# Altium footprint library sun_library.PcbLib: 412 footprints (part 16 of 26) (continued)
## QFN36_3.9 [mm] "36-Lead thin QFN, 0.5mm Pitch, 6mm x 6mm body"
height 0.85
pads (37):
  rect 0.85x0.21 smd paste-0.15 mask+0.05: 1(-3,2) 2(-3,1.5) 3(-3,1) 4(-3,0.5) 5(-3,0) 6(-3,-0.5) 7(-3,-1) 8(-3,-1.5) 9(-3,-2) 19(3,-2) 20(3,-1.5) 21(3,-1) 22(3,-0.5) 23(3,0) 24(3,0.5) 25(3,1) 26(3,1.5) 27(3,2)
  rect 0.21x0.85 smd paste-0.15 mask+0.05: 10(-2,-3) 11(-1.5,-3) 12(-1,-3) 13(-0.5,-3) 14(0,-3) 15(0.5,-3) 16(1,-3) 17(1.5,-3) 18(2,-3) 28(2,3) 29(1.5,3) 30(1,3) 31(0.5,3) 32(0,3) 33(-0.5,3) 34(-1,3) 35(-1.5,3) 36(-2,3)
  rect 3.9x3.9 smd paste-3: 37(0,0)
via -1.7,0.7 diameter 0.6 hole 0.3
via -1.7,-0.6 diameter 0.6 hole 0.3
via -0.6,1.7 diameter 0.6 hole 0.3
via 0.7,1.7 diameter 0.6 hole 0.3
via 1.7,0.7 diameter 0.6 hole 0.3
via 0.7,0.7 diameter 0.6 hole 0.3
via -0.6,0.7 diameter 0.6 hole 0.3
via -0.6,-0.6 diameter 0.6 hole 0.3
via -0.6,-1.7 diameter 0.6 hole 0.3
via 0.7,-1.7 diameter 0.6 hole 0.3
via 0.7,-0.6 diameter 0.6 hole 0.3
via 1.6,-0.6 diameter 0.6 hole 0.3
Top Overlay:
  circle w0.15: c-3.95,2.25 r0.125
  lines w0.15: -3.1,-2.8 -3.1,-3.1 -2.8,-3.1 ; -3.1,2.8 -3.1,3.1 -2.8,3.1 ; 2.8,-3.1 3.1,-3.1 3.1,-2.8 ; 2.8,3.1 3.1,3.1 3.1,2.8
Top Paste:
  drawing of 45 lines, arcs and shapes, not listed
Bottom Solder:
  rectangle: -2.1,-2.1 2.1,2.1
TopAssy 13:
  circle w0.15: c-2.175,2.175 r0.5
  lines w0.15: -3.175,-2.063 -3.175,-1.937 ; -3.175,-1.563 -3.175,-1.438 ; -3.175,-1.063 -3.175,-0.938 ; -3.175,-0.563 -3.175,-0.438 ; -3.175,-0.063 -3.175,0.063 ; -3.175,0.437 -3.175,0.563 ; -3.175,0.937 -3.175,1.062 ; -3.175,1.437 -3.175,1.562 ; -3.175,1.937 -3.175,2.062 ; -2.062,-3.175 -1.937,-3.175 ; -2.063,3.175 -1.937,3.175 ; -1.562,-3.175 -1.437,-3.175 ; -1.563,3.175 -1.438,3.175 ; -1.062,-3.175 -0.937,-3.175 ; -1.063,3.175 -0.938,3.175 ; -0.563,-3.175 -0.437,-3.175 ; -0.563,3.175 -0.438,3.175 ; -0.063,-3.175 0.063,-3.175 ; -0.063,3.175 0.063,3.175 ; 0.438,-3.175 0.563,-3.175 ; 0.437,3.175 0.563,3.175 ; 0.938,-3.175 1.063,-3.175 ; 0.937,3.175 1.062,3.175 ; 1.438,-3.175 1.563,-3.175 ; 1.437,3.175 1.562,3.175 ; 1.937,-3.175 2.063,-3.175 ; 1.937,3.175 2.062,3.175 ; 3.175,-2.062 3.175,-1.937 ; 3.175,-1.562 3.175,-1.437 ; 3.175,-1.062 3.175,-0.937 ; 3.175,-0.563 3.175,-0.437 ; 3.175,-0.063 3.175,0.063 ; 3.175,0.438 3.175,0.563 ; 3.175,0.938 3.175,1.063 ; 3.175,1.438 3.175,1.563 ; 3.175,1.937 3.175,2.063 ; -3.075,-3.075 3.075,-3.075 3.075,3.075 -3.075,3.075 -3.075,-3.075
CourtTop 15:
  lines w0.05: -0.5,0 0.5,0 ; 0,-0.5 0,0.5 ; -3.65,-3.65 3.65,-3.65 3.65,3.65 -3.65,3.65 -3.65,-3.65
3D body "User Library-TQFN-36.STEP": height 0.8, standoff 0, extent -3.06,-3.06 3.06,3.06

## QFN40 [mm] "QFN, 40-Leads, Body 6x6mm, Pitch 0.5mm, IPC Medium Density"
height 0.8
pads (41):
  oval 0.8x0.25 smd mask+0.07: 1(-3,2.25) 2(-3,1.75) 3(-3,1.25) 4(-3,0.75) 5(-3,0.25) 6(-3,-0.25) 7(-3,-0.75) 8(-3,-1.25) 9(-3,-1.75) 10(-3,-2.25) 21(3,-2.25) 22(3,-1.75) 23(3,-1.25) 24(3,-0.75) 25(3,-0.25) 26(3,0.25) 27(3,0.75) 28(3,1.25) 29(3,1.75) 30(3,2.25)
  oval 0.25x0.8 smd mask+0.07: 11(-2.25,-3) 12(-1.75,-3) 13(-1.25,-3) 14(-0.75,-3) 15(-0.25,-3) 16(0.25,-3) 17(0.75,-3) 18(1.25,-3) 19(1.75,-3) 20(2.25,-3) 31(2.25,3) 32(1.75,3) 33(1.25,3) 34(0.75,3) 35(0.25,3) 36(-0.25,3) 37(-0.75,3) 38(-1.25,3) 39(-1.75,3) 40(-2.25,3)
  rect 4.3x4.3 smd paste-5 mask+0.07: 41(0,0)
via 1.5,1.5 diameter 0.6 hole 0.3
via 0.5,1.5 diameter 0.6 hole 0.3
via -0.5,1.5 diameter 0.6 hole 0.3
via -1.5,1.5 diameter 0.6 hole 0.3
via -1.5,0.5 diameter 0.6 hole 0.3
via -0.5,0.5 diameter 0.6 hole 0.3
via 0.5,0.5 diameter 0.6 hole 0.3
via 1.5,0.5 diameter 0.6 hole 0.3
via -1.5,-0.5 diameter 0.6 hole 0.3
via -0.5,-0.5 diameter 0.6 hole 0.3
via 0.5,-0.5 diameter 0.6 hole 0.3
via 1.5,-0.5 diameter 0.6 hole 0.3
via -1.5,-1.5 diameter 0.6 hole 0.3
via -0.5,-1.5 diameter 0.6 hole 0.3
via 0.5,-1.5 diameter 0.6 hole 0.3
via 1.5,-1.5 diameter 0.6 hole 0.3
Top Overlay:
  circle w0.15: c-3.95,2.25 r0.125
  lines w0.15: -3.1,-2.8 -3.1,-3.1 -2.8,-3.1 ; -3.1,2.8 -3.1,3.1 -2.8,3.1 ; 2.8,-3.1 3.1,-3.1 3.1,-2.8 ; 2.8,3.1 3.1,3.1 3.1,2.8
Top Paste:
  rectangle: -1.725,0.85 -0.825,1.75
  rectangle: -0.475,0.85 0.425,1.75
  rectangle: 0.775,0.85 1.675,1.75
  rectangle: -1.725,-0.4 -0.825,0.5
  rectangle: -0.475,-0.4 0.425,0.5
  rectangle: 0.775,-0.4 1.675,0.5
  rectangle: 0.775,-1.65 1.675,-0.75
  rectangle: -0.475,-1.65 0.425,-0.75
  rectangle: -1.725,-1.65 -0.825,-0.75
Bottom Solder:
  rectangle: -2.2,-2.2 2.2,2.2
TopAssy 13:
  circle w0.15: c-2.175,2.175 r0.5
  lines w0.15: -3.175,-2.312 -3.175,-2.187 ; -3.175,-1.813 -3.175,-1.687 ; -3.175,-1.313 -3.175,-1.188 ; -3.175,-0.813 -3.175,-0.688 ; -3.175,-0.313 -3.175,-0.188 ; -3.175,0.188 -3.175,0.313 ; -3.175,0.687 -3.175,0.813 ; -3.175,1.187 -3.175,1.312 ; -3.175,1.687 -3.175,1.812 ; -3.175,2.187 -3.175,2.312 ; -2.312,-3.175 -2.187,-3.175 ; -2.312,3.175 -2.187,3.175 ; -1.812,-3.175 -1.687,-3.175 ; -1.813,3.175 -1.687,3.175 ; -1.312,-3.175 -1.187,-3.175 ; -1.313,3.175 -1.188,3.175 ; -0.813,-3.175 -0.687,-3.175 ; -0.813,3.175 -0.688,3.175 ; -0.313,-3.175 -0.187,-3.175 ; -0.313,3.175 -0.187,3.175 ; 0.187,-3.175 0.313,-3.175 ; 0.187,3.175 0.313,3.175 ; 0.688,-3.175 0.813,-3.175 ; 0.687,3.175 0.813,3.175 ; 1.188,-3.175 1.313,-3.175 ; 1.187,3.175 1.312,3.175 ; 1.687,-3.175 1.813,-3.175 ; 1.687,3.175 1.812,3.175 ; 2.187,-3.175 2.312,-3.175 ; 2.187,3.175 2.312,3.175 ; 3.175,-2.312 3.175,-2.187 ; 3.175,-1.812 3.175,-1.687 ; 3.175,-1.312 3.175,-1.187 ; 3.175,-0.813 3.175,-0.687 ; 3.175,-0.313 3.175,-0.187 ; 3.175,0.187 3.175,0.313 ; 3.175,0.688 3.175,0.813 ; 3.175,1.188 3.175,1.313 ; 3.175,1.687 3.175,1.813 ; 3.175,2.187 3.175,2.312 ; -3.075,-3.075 3.075,-3.075 3.075,3.075 -3.075,3.075 -3.075,-3.075
CourtTop 15:
  lines w0.05: -0.5,0 0.5,0 ; 0,-0.5 0,0.5 ; -3.65,-3.65 3.65,-3.65 3.65,3.65 -3.65,3.65 -3.65,-3.65
3D body: height 0.8, standoff 0, extent -3.075,-3.075 3.075,3.075

## QFN43P50_900X350X80L40X25T700X150N [mm] "Quad Flat No-Lead (QFN with Tab), 0.50 mm pitch; rect., 17 pin X 4 pin, 9.00 mm L X 3.50 mm W X 0.80 mm H body"
height 0.8
pads (43):
  rrect52% 0.27x0.76 smd mask+0.05: 1(-4,-1.635) 2(-3.5,-1.635) 3(-3,-1.635) 4(-2.5,-1.635) 5(-2,-1.635) 6(-1.5,-1.635) 7(-1,-1.635) 8(-0.5,-1.635) 9(0,-1.635) 10(0.5,-1.635) 11(1,-1.635) 12(1.5,-1.635) 13(2,-1.635) 14(2.5,-1.635) 15(3,-1.635) 16(3.5,-1.635) 17(4,-1.635) 22(4,1.635) 23(3.5,1.635) 24(3,1.635) 25(2.5,1.635) 26(2,1.635) 27(1.5,1.635) 28(1,1.635) 29(0.5,1.635) 30(0,1.635) 31(-0.5,1.635) 32(-1,1.635) 33(-1.5,1.635) 34(-2,1.635) 35(-2.5,1.635) 36(-3,1.635) 37(-3.5,1.635) 38(-4,1.635)
  rrect52% 0.76x0.27 smd mask+0.05: 18(4.385,-0.75) 19(4.385,-0.25) 20(4.385,0.25) 21(4.385,0.75) 39(-4.385,0.75) 40(-4.385,0.25) 41(-4.385,-0.25) 42(-4.385,-0.75)
  rect 7x1.5 smd paste-7 mask+0.05: 43(0,0)
via 1.36,0 diameter 0.6 hole 0.3
via 2.72,0 diameter 0.6 hole 0.3
via 0,0 diameter 0.6 hole 0.3
via -1.36,0 diameter 0.6 hole 0.3
via -2.67,0 diameter 0.6 hole 0.3
Top Overlay:
  circle w0.15: c-4.875,-1.825 r0.125
  lines w0.15: -4.55,-1.25 -4.55,-1.8 -4.4,-1.8 ; -4.55,1.25 -4.55,1.8 -4.4,1.8 ; 4.4,-1.8 4.55,-1.8 4.55,-1.25 ; 4.4,1.8 4.55,1.8 4.55,1.25
Top Paste:
  region: 3.435,-0.415 2.165,-0.415 2.165,0.415 3.435,0.415
  region: 2.035,-0.415 0.765,-0.415 0.765,0.415 2.035,0.415
  region: 0.635,-0.415 -0.635,-0.415 -0.635,0.415 0.635,0.415
  region: -0.765,-0.415 -2.035,-0.415 -2.035,0.415 -0.765,0.415
  region: -2.165,-0.415 -3.435,-0.415 -3.435,0.415 -2.165,0.415
Bottom Solder:
  rectangle: -3.6,-0.8 3.6,0.8
TopAssy 13:
  drawing of 177 lines, arcs and shapes, not listed
CourtTop 15:
  circle w0.05: c0,0 r0.25
  lines w0.05: -0.35,0 0.35,0 ; 0,-0.35 0,0.35 ; -4.965,-1.085 -4.965,1.085 -4.75,1.085 -4.75,2 -4.335,2 -4.335,2.215 4.335,2.215 4.335,2 4.75,2 4.75,1.085 4.965,1.085 4.965,-1.085 4.75,-1.085 4.75,-2 4.335,-2 4.335,-2.215 -4.335,-2.215 -4.335,-2 -4.75,-2 -4.75,-1.085 -4.965,-1.085
3D body "QFN43P50_900X350X80L40X25T700X150.STEP": height 0.8, standoff 0, extent -4.55,-1.8 4.55,1.8

## QFN48 [mm] "QFN, 48-Leads, Body 7x7mm, Pitch 0.5mm, IPC Medium Density"
height 0.9
pads (49):
  oval 0.75x0.2 smd mask+0.075: 1(-3.525,2.75) 2(-3.525,2.25) 3(-3.525,1.75) 4(-3.525,1.25) 5(-3.525,0.75) 6(-3.525,0.25) 7(-3.525,-0.25) 8(-3.525,-0.75) 9(-3.525,-1.25) 10(-3.525,-1.75) 11(-3.525,-2.25) 12(-3.525,-2.75) 25(3.525,-2.75) 26(3.525,-2.25) 27(3.525,-1.75) 28(3.525,-1.25) 29(3.525,-0.75) 30(3.525,-0.25) 31(3.525,0.25) 32(3.525,0.75) 33(3.525,1.25) 34(3.525,1.75) 35(3.525,2.25) 36(3.525,2.75)
  oval 0.2x0.75 smd mask+0.075: 13(-2.75,-3.525) 14(-2.25,-3.525) 15(-1.75,-3.525) 16(-1.25,-3.525) 17(-0.75,-3.525) 18(-0.25,-3.525) 19(0.25,-3.525) 20(0.75,-3.525) 21(1.25,-3.525) 22(1.75,-3.525) 23(2.25,-3.525) 24(2.75,-3.525) 37(2.75,3.525) 38(2.25,3.525) 39(1.75,3.525) 40(1.25,3.525) 41(0.75,3.525) 42(0.25,3.525) 43(-0.25,3.525) 44(-0.75,3.525) 45(-1.25,3.525) 46(-1.75,3.525) 47(-2.25,3.525) 48(-2.75,3.525)
  rect 5.1x5.1 smd paste-3 mask+0.075: 49(0,0)
via -1,-1 diameter 0.6 hole 0.3
via -1,1 diameter 0.6 hole 0.3
via 1,1 diameter 0.6 hole 0.3
via 1,-1 diameter 0.6 hole 0.3
via 2,-2 diameter 0.6 hole 0.3
via -2,-2 diameter 0.6 hole 0.3
via 0,-2 diameter 0.6 hole 0.3
via 2,0 diameter 0.6 hole 0.3
via 2,2 diameter 0.6 hole 0.3
via 0,2 diameter 0.6 hole 0.3
via -2,2 diameter 0.6 hole 0.3
via -2,0 diameter 0.6 hole 0.3
via 0,0 diameter 0.6 hole 0.3
Top Overlay:
  circle w0.15: c-4.375,3.575 r0.125
  lines w0.15: -3.725,-3.3 -3.725,-3.725 -3.3,-3.725 ; -3.725,3.3 -3.725,3.725 -3.3,3.725 ; 3.3,-3.725 3.725,-3.725 3.725,-3.3 ; 3.3,3.725 3.725,3.725 3.725,3.3
Top Paste:
  rectangle: 1.35,1.35 2.25,2.25
  rectangle: 0.15,1.35 1.05,2.25
  rectangle: -1.05,1.35 -0.15,2.25
  rectangle: -2.25,1.35 -1.35,2.25
  rectangle: -2.25,0.15 -1.35,1.05
  rectangle: -1.05,0.15 -0.15,1.05
  rectangle: 0.15,0.15 1.05,1.05
  rectangle: 1.35,0.15 2.25,1.05
  rectangle: 1.35,-1.05 2.25,-0.15
  rectangle: 0.15,-1.05 1.05,-0.15
  rectangle: -1.05,-1.05 -0.15,-0.15
  rectangle: -2.25,-1.05 -1.35,-0.15
  rectangle: -2.25,-2.25 -1.35,-1.35
  rectangle: -1.05,-2.25 -0.15,-1.35
  rectangle: 0.15,-2.25 1.05,-1.35
  rectangle: 1.35,-2.25 2.25,-1.35
Bottom Solder:
  rectangle: -2.6,-2.6 2.6,2.6
TopAssy 13:
  circle w0.15: c-2.675,2.675 r0.5
  lines w0.15: -3.675,-2.812 -3.675,-2.687 ; -3.675,-2.312 -3.675,-2.187 ; -3.675,-1.812 -3.675,-1.687 ; -3.675,-1.312 -3.675,-1.187 ; -3.675,-0.813 -3.675,-0.687 ; -3.675,-0.313 -3.675,-0.187 ; -3.675,0.188 -3.675,0.313 ; -3.675,0.688 -3.675,0.813 ; -3.675,1.188 -3.675,1.313 ; -3.675,1.687 -3.675,1.813 ; -3.675,2.188 -3.675,2.313 ; -3.675,2.688 -3.675,2.813 ; -2.813,-3.675 -2.688,-3.675 ; -2.812,3.675 -2.687,3.675 ; -2.313,-3.675 -2.188,-3.675 ; -2.312,3.675 -2.187,3.675 ; -1.813,-3.675 -1.687,-3.675 ; -1.812,3.675 -1.687,3.675 ; -1.313,-3.675 -1.188,-3.675 ; -1.312,3.675 -1.187,3.675 ; -0.813,-3.675 -0.688,-3.675 ; -0.813,3.675 -0.687,3.675 ; -0.313,-3.675 -0.188,-3.675 ; -0.313,3.675 -0.187,3.675 ; 0.187,-3.675 0.313,-3.675 ; 0.188,3.675 0.313,3.675 ; 0.687,-3.675 0.813,-3.675 ; 0.688,3.675 0.813,3.675 ; 1.187,-3.675 1.312,-3.675 ; 1.188,3.675 1.313,3.675 ; 1.687,-3.675 1.812,-3.675 ; 1.687,3.675 1.813,3.675 ; 2.187,-3.675 2.312,-3.675 ; 2.188,3.675 2.313,3.675 ; 2.687,-3.675 2.812,-3.675 ; 2.688,3.675 2.813,3.675 ; 3.675,-2.813 3.675,-2.688 ; 3.675,-2.313 3.675,-2.188 ; 3.675,-1.813 3.675,-1.687 ; 3.675,-1.313 3.675,-1.188 ; 3.675,-0.813 3.675,-0.688 ; 3.675,-0.313 3.675,-0.188 ; 3.675,0.187 3.675,0.312 ; 3.675,0.687 3.675,0.813 ; 3.675,1.187 3.675,1.312 ; 3.675,1.687 3.675,1.812 ; 3.675,2.187 3.675,2.312 ; 3.675,2.687 3.675,2.812 ; -3.575,-3.575 -3.575,3.575 3.575,3.575 3.575,-3.575 -3.575,-3.575
CourtTop 15:
  lines w0.05: -0.5,0 0.5,0 ; 0,-0.5 0,0.5 ; -4.15,-4.15 -4.15,4.15 4.15,4.15 4.15,-4.15 -4.15,-4.15
3D body "User Library-QFN48_7x7.STEP": height 0.78, standoff -0.02, extent -3.51,-3.51 3.51,3.51

## QFN48P40_P600X600X90 [mm]
height 0.9
pads (49):
  oval 0.65x0.2 smd mask+0.05: 1(-3.025,2.2) 2(-3.025,1.8) 3(-3.025,1.4) 4(-3.025,1) 5(-3.025,0.6) 6(-3.025,0.2) 7(-3.025,-0.2) 8(-3.025,-0.6) 9(-3.025,-1) 10(-3.025,-1.4) 11(-3.025,-1.8) 12(-3.025,-2.2) 25(3.025,-2.2) 26(3.025,-1.8) 27(3.025,-1.4) 28(3.025,-1) 29(3.025,-0.6) 30(3.025,-0.2) 31(3.025,0.2) 32(3.025,0.6) 33(3.025,1) 34(3.025,1.4) 35(3.025,1.8) 36(3.025,2.2)
  oval 0.2x0.65 smd mask+0.05: 13(-2.2,-3.025) 14(-1.8,-3.025) 15(-1.4,-3.025) 16(-1,-3.025) 17(-0.6,-3.025) 18(-0.2,-3.025) 19(0.2,-3.025) 20(0.6,-3.025) 21(1,-3.025) 22(1.4,-3.025) 23(1.8,-3.025) 24(2.2,-3.025) 37(2.2,3.025) 38(1.8,3.025) 39(1.4,3.025) 40(1,3.025) 41(0.6,3.025) 42(0.2,3.025) 43(-0.2,3.025) 44(-0.6,3.025) 45(-1,3.025) 46(-1.4,3.025) 47(-1.8,3.025) 48(-2.2,3.025)
  rect 4.6x4.6 smd paste-3.9 mask+0.075: 49(0,0)
via -1.8,1.8 diameter 0.7 hole 0.3
via -0.6,1.8 diameter 0.7 hole 0.3
via 0.6,1.8 diameter 0.7 hole 0.3
via 1.8,1.8 diameter 0.7 hole 0.3
via -1.8,0.6 diameter 0.7 hole 0.3
via -0.6,0.6 diameter 0.7 hole 0.3
via 0.6,0.6 diameter 0.7 hole 0.3
via 1.8,0.6 diameter 0.7 hole 0.3
via -1.8,-0.6 diameter 0.7 hole 0.3
via -0.6,-0.6 diameter 0.7 hole 0.3
via 0.6,-0.6 diameter 0.7 hole 0.3
via 1.8,-0.6 diameter 0.7 hole 0.3
via -1.8,-1.8 diameter 0.7 hole 0.3
via -0.6,-1.8 diameter 0.7 hole 0.3
via 0.6,-1.8 diameter 0.7 hole 0.3
via 1.8,-1.8 diameter 0.7 hole 0.3
Top Overlay:
  circle w0.25: c-3.5,2.8 r0.125
  lines w0.2: -3.1,-2.7 -3.1,-3.1 -2.7,-3.1 ; -3.1,2.7 -3.1,3.1 -2.7,3.1 ; 2.7,-3.1 3.1,-3.1 3.1,-2.7 ; 2.7,3.1 3.1,3.1 3.1,2.7
Top Paste:
  rectangle: 1.35,-2.25 2.25,-1.35
  rectangle: 0.15,-2.25 1.05,-1.35
  rectangle: -1.05,-2.25 -0.15,-1.35
  rectangle: -2.25,-2.25 -1.35,-1.35
  rectangle: -2.25,-1.05 -1.35,-0.15
  rectangle: -1.05,-1.05 -0.15,-0.15
  rectangle: 0.15,-1.05 1.05,-0.15
  rectangle: 1.35,-1.05 2.25,-0.15
  rectangle: 1.35,0.15 2.25,1.05
  rectangle: 0.15,0.15 1.05,1.05
  rectangle: -1.05,0.15 -0.15,1.05
  rectangle: -2.25,0.15 -1.35,1.05
  rectangle: -2.25,1.35 -1.35,2.25
  rectangle: -1.05,1.35 -0.15,2.25
  rectangle: 0.15,1.35 1.05,2.25
  rectangle: 1.35,1.35 2.25,2.25
Bottom Solder:
  rectangle: -2.4,-2.4 2.4,2.4
TopAssy 13:
  drawing of 197 lines, arcs and shapes, not listed
CourtTop 15:
  lines w0.1: -0.5,0 0.5,0 ; 0,-0.5 0,0.5 ; -3.6,-3.6 -3.6,3.6 3.6,3.6 3.6,-3.6 -3.6,-3.6
3D body "User Library-QFN48.step": height 0.86, standoff -0.01, extent -3.02,-3.02 3.02,3.02

## QFN49P40_600X600X100L40X17T440N [mm] "Quad Flat No-Lead (QFN with Tab), 0.40 mm pitch; square, 12 pin X 12 pin, 6.00 mm L X 6.00 mm W X 1.00 mm H body"
height 1
pads (49):
  rrect53% 0.8x0.19 smd mask+0.075: 1(-2.885,2.2) 2(-2.885,1.8) 3(-2.885,1.4) 4(-2.885,1) 5(-2.885,0.6) 6(-2.885,0.2) 7(-2.885,-0.2) 8(-2.885,-0.6) 9(-2.885,-1) 10(-2.885,-1.4) 11(-2.885,-1.8) 12(-2.885,-2.2) 25(2.885,-2.2) 26(2.885,-1.8) 27(2.885,-1.4) 28(2.885,-1) 29(2.885,-0.6) 30(2.885,-0.2) 31(2.885,0.2) 32(2.885,0.6) 33(2.885,1) 34(2.885,1.4) 35(2.885,1.8) 36(2.885,2.2)
  rrect53% 0.19x0.8 smd mask+0.075: 13(-2.2,-2.885) 14(-1.8,-2.885) 15(-1.4,-2.885) 16(-1,-2.885) 17(-0.6,-2.885) 18(-0.2,-2.885) 19(0.2,-2.885) 20(0.6,-2.885) 21(1,-2.885) 22(1.4,-2.885) 23(1.8,-2.885) 24(2.2,-2.885) 37(2.2,2.885) 38(1.8,2.885) 39(1.4,2.885) 40(1,2.885) 41(0.6,2.885) 42(0.2,2.885) 43(-0.2,2.885) 44(-0.6,2.885) 45(-1,2.885) 46(-1.4,2.885) 47(-1.8,2.885) 48(-2.2,2.885)
  rect 3.9x3.9 smd paste-3.9 mask+0.075: 49(0,0)
via 1.5,0.5 diameter 0.6 hole 0.3
via 0.5,1.5 diameter 0.6 hole 0.3
via 1.5,1.5 diameter 0.6 hole 0.3
via 0.5,0.5 diameter 0.6 hole 0.3
via 1.5,-0.5 diameter 0.6 hole 0.3
via 1.5,-1.5 diameter 0.6 hole 0.3
via 0.5,-0.5 diameter 0.6 hole 0.3
via 0.5,-1.5 diameter 0.6 hole 0.3
via -0.5,0.5 diameter 0.6 hole 0.3
via -0.5,1.5 diameter 0.6 hole 0.3
via -1.5,1.5 diameter 0.6 hole 0.3
via -1.5,0.5 diameter 0.6 hole 0.3
via -0.5,-0.5 diameter 0.6 hole 0.3
via -0.5,-1.5 diameter 0.6 hole 0.3
via -1.5,-0.5 diameter 0.6 hole 0.3
via -1.5,-1.5 diameter 0.6 hole 0.3
Top:
  region: 0,-2.2 -2.1,-2.2 -2.116,-2.199 -2.131,-2.195 -2.145,-2.189 -2.159,-2.181 -2.171,-2.171 -2.181,-2.159 -2.189,-2.145 -2.195,-2.131 -2.199,-2.116 -2.2,1.95 -1.95,2.2 2.1,2.2 2.116,2.199 2.131,2.195 2.145,2.189 2.159,2.181 2.171,2.171 2.181,2.159 2.189,2.145 2.195,2.131 2.199,2.116 2.2,-2.1 2.199,-2.116 2.195,-2.131 2.189,-2.145 2.181,-2.159 2.171,-2.171 2.159,-2.181 2.145,-2.189 2.131,-2.195 2.116,-2.199 2.1,-2.2
Top Overlay:
  circle w0.15: c-3.645,2.2 r0.075
  lines w0.15: -3.135,2.58 -3.075,2.58 -3.075,3.075 -2.58,3.075 ; -3.075,-2.58 -3.075,-3.075 -2.58,-3.075 ; 2.58,-3.075 3.075,-3.075 3.075,-2.58 ; 2.58,3.075 3.075,3.075 3.075,2.58
Top Paste:
  region: 0.32,0.32 0.32,1.88 1.88,1.88 1.88,0.32
  region: 0.32,-1.88 0.32,-0.32 1.88,-0.32 1.88,-1.88
  region: -1.88,0.32 -1.88,1.88 -0.32,1.88 -0.32,0.32
  region: -1.88,-1.88 -1.88,-0.32 -0.32,-0.32 -0.32,-1.88
Top Solder:
  region: 0,-2.2 -2.1,-2.2 -2.116,-2.199 -2.131,-2.195 -2.145,-2.189 -2.159,-2.181 -2.171,-2.171 -2.181,-2.159 -2.189,-2.145 -2.195,-2.131 -2.199,-2.116 -2.2,1.95 -1.95,2.2 2.1,2.2 2.116,2.199 2.131,2.195 2.145,2.189 2.159,2.181 2.171,2.171 2.181,2.159 2.189,2.145 2.195,2.131 2.199,2.116 2.2,-2.1 2.199,-2.116 2.195,-2.131 2.189,-2.145 2.181,-2.159 2.171,-2.171 2.159,-2.181 2.145,-2.189 2.131,-2.195 2.116,-2.199 2.1,-2.2
Bottom Solder:
  rectangle: -2.3,-2.3 2.3,2.3
TopAssy 13:
  drawing of 205 lines, arcs and shapes, not listed
CourtTop 15:
  circle w0.05: c0,0 r0.25
  lines w0.05: -0.35,0 0.35,0 ; 0,-0.35 0,0.35 ; -3.485,-2.495 -3.485,2.495 -3.28,2.495 -3.28,3.28 -2.495,3.28 -2.495,3.485 2.495,3.485 2.495,3.28 3.28,3.28 3.28,2.495 3.485,2.495 3.485,-2.495 3.28,-2.495 3.28,-3.28 2.495,-3.28 2.495,-3.485 -2.495,-3.485 -2.495,-3.28 -3.28,-3.28 -3.28,-2.495 -3.485,-2.495
3D body "QFN49P40_600X600X100L40X17T440.STEP": height 1, standoff 0, extent -3.05,-3.05 3.05,3.05

## QFN57P50_1100X500X80L40X24T840X240N [mm] "Quad Flat No-Lead (QFN with Tab), 0.50 mm pitch; rect., 20 pin X 8 pin, 11.00 mm L X 5.00 mm W X 0.80 mm H body"
height 0.8
pads (57):
  rrect54% 0.26x0.78 smd mask+0.05: 1(-4.75,-2.385) 2(-4.25,-2.385) 3(-3.75,-2.385) 4(-3.25,-2.385) 5(-2.75,-2.385) 6(-2.25,-2.385) 7(-1.75,-2.385) 8(-1.25,-2.385) 9(-0.75,-2.385) 10(-0.25,-2.385) 11(0.25,-2.385) 12(0.75,-2.385) 13(1.25,-2.385) 14(1.75,-2.385) 15(2.25,-2.385) 16(2.75,-2.385) 17(3.25,-2.385) 18(3.75,-2.385) 19(4.25,-2.385) 20(4.75,-2.385) 29(4.75,2.385) 30(4.25,2.385) 31(3.75,2.385) 32(3.25,2.385) 33(2.75,2.385) 34(2.25,2.385) 35(1.75,2.385) 36(1.25,2.385) 37(0.75,2.385) 38(0.25,2.385) 39(-0.25,2.385) 40(-0.75,2.385) 41(-1.25,2.385) 42(-1.75,2.385) 43(-2.25,2.385) 44(-2.75,2.385) 45(-3.25,2.385) 46(-3.75,2.385) 47(-4.25,2.385) 48(-4.75,2.385)
  rrect54% 0.78x0.26 smd mask+0.05: 21(5.385,-1.75) 22(5.385,-1.25) 23(5.385,-0.75) 24(5.385,-0.25) 25(5.385,0.25) 26(5.385,0.75) 27(5.385,1.25) 28(5.385,1.75) 49(-5.385,1.75) 50(-5.385,1.25) 51(-5.385,0.75) 52(-5.385,0.25) 53(-5.385,-0.25) 54(-5.385,-0.75) 55(-5.385,-1.25) 56(-5.385,-1.75)
  rect 8.4x2.4 smd paste-8.4 mask+0.05: 57(0,0)
via 1.36,0.7 diameter 0.6 hole 0.3
via 2.72,0.7 diameter 0.6 hole 0.3
via 0,0.7 diameter 0.6 hole 0.3
via -1.36,0.7 diameter 0.6 hole 0.3
via -2.67,0.7 diameter 0.6 hole 0.3
via 1.36,-0.6 diameter 0.6 hole 0.3
via 2.72,-0.6 diameter 0.6 hole 0.3
via 0,-0.6 diameter 0.6 hole 0.3
via -1.36,-0.6 diameter 0.6 hole 0.3
via -2.67,-0.6 diameter 0.6 hole 0.3
Top Overlay:
  circle w0.15: c-5.4,-3 r0.125
  lines w0.15: -5.6,-2.2 -5.6,-2.6 -5.2,-2.6 ; -5.6,2.2 -5.6,2.6 -5.2,2.6 ; 5.2,-2.6 5.6,-2.6 5.6,-2.2 ; 5.2,2.6 5.6,2.6 5.6,2.2
Top Paste:
  region: 4.115,-0.685 2.885,-0.685 2.885,0.685 4.115,0.685
  region: 2.715,-0.685 1.485,-0.685 1.485,0.685 2.715,0.685
  region: 1.315,-0.685 0.085,-0.685 0.085,0.685 1.315,0.685
  region: -0.085,-0.685 -1.315,-0.685 -1.315,0.685 -0.085,0.685
  region: -1.485,-0.685 -2.715,-0.685 -2.715,0.685 -1.485,0.685
  region: -2.885,-0.685 -4.115,-0.685 -4.115,0.685 -2.885,0.685
Bottom Solder:
  rectangle: -4.3,-1.3 4.3,1.3
TopAssy 13:
  drawing of 232 lines, arcs and shapes, not listed
CourtTop 15:
  circle w0.05: c0,0 r0.25
  lines w0.05: -0.35,0 0.35,0 ; 0,-0.35 0,0.35 ; -5.975,-2.08 -5.975,2.08 -5.78,2.08 -5.78,2.78 -5.08,2.78 -5.08,2.975 5.08,2.975 5.08,2.78 5.78,2.78 5.78,2.08 5.975,2.08 5.975,-2.08 5.78,-2.08 5.78,-2.78 5.08,-2.78 5.08,-2.975 -5.08,-2.975 -5.08,-2.78 -5.78,-2.78 -5.78,-2.08 -5.975,-2.08
3D body "QFN57P50_1100X500X80L40X24T840X240.STEP": height 0.8, standoff 0, extent -5.55,-2.55 5.55,2.55

## QFN64 [mm] "QFN, 64-Leads, Body 9,00x9,00mm, Pitch 0,50mm, Thermal Pad 5,75x5,75mm, IPC Medium Density"
height 1
pads (65):
  oct 0.75x0.23 smd mask+0.07: 1(-4.475,3.75) 2(-4.475,3.25) 3(-4.475,2.75) 4(-4.475,2.25) 5(-4.475,1.75) 6(-4.475,1.25) 7(-4.475,0.75) 8(-4.475,0.25) 9(-4.475,-0.25) 10(-4.475,-0.75) 11(-4.475,-1.25) 12(-4.475,-1.75) 13(-4.475,-2.25) 14(-4.475,-2.75) 15(-4.475,-3.25) 16(-4.475,-3.75) 33(4.475,-3.75) 34(4.475,-3.25) 35(4.475,-2.75) 36(4.475,-2.25) 37(4.475,-1.75) 38(4.475,-1.25) 39(4.475,-0.75) 40(4.475,-0.25) 41(4.475,0.25) 42(4.475,0.75) 43(4.475,1.25) 44(4.475,1.75) 45(4.475,2.25) 46(4.475,2.75) 47(4.475,3.25) 48(4.475,3.75)
  oct 0.23x0.75 smd mask+0.07: 17(-3.75,-4.475) 18(-3.25,-4.475) 19(-2.75,-4.475) 20(-2.25,-4.475) 21(-1.75,-4.475) 22(-1.25,-4.475) 23(-0.75,-4.475) 24(-0.25,-4.475) 25(0.25,-4.475) 26(0.75,-4.475) 27(1.25,-4.475) 28(1.75,-4.475) 29(2.25,-4.475) 30(2.75,-4.475) 31(3.25,-4.475) 32(3.75,-4.475) 49(3.75,4.475) 50(3.25,4.475) 51(2.75,4.475) 52(2.25,4.475) 53(1.75,4.475) 54(1.25,4.475) 55(0.75,4.475) 56(0.25,4.475) 57(-0.25,4.475) 58(-0.75,4.475) 59(-1.25,4.475) 60(-1.75,4.475) 61(-2.25,4.475) 62(-2.75,4.475) 63(-3.25,4.475) 64(-3.75,4.475)
  rect 7.2x7.2 smd paste-4: 65(0,0)
via -2.04,3.35 diameter 0.6 hole 0.3
via -0.68,3.35 diameter 0.6 hole 0.3
via 0.68,3.35 diameter 0.6 hole 0.3
via 2.04,3.35 diameter 0.6 hole 0.3
via -3.35,0.68 diameter 0.6 hole 0.3
via -2.04,0.68 diameter 0.6 hole 0.3
via -0.68,0.68 diameter 0.6 hole 0.3
via 0.68,0.68 diameter 0.6 hole 0.3
via 2.04,0.68 diameter 0.6 hole 0.3
via 3.35,0.68 diameter 0.6 hole 0.3
via 2.04,-0.68 diameter 0.6 hole 0.3
via 0.68,-0.68 diameter 0.6 hole 0.3
via -0.68,-0.68 diameter 0.6 hole 0.3
via -2.04,-0.68 diameter 0.6 hole 0.3
via -3.35,-0.68 diameter 0.6 hole 0.3
via 3.35,-0.68 diameter 0.6 hole 0.3
via 3.35,-2.04 diameter 0.6 hole 0.3
via 2.04,-2.04 diameter 0.6 hole 0.3
via 0.68,-2.04 diameter 0.6 hole 0.3
via -0.68,-2.04 diameter 0.6 hole 0.3
via -2.04,-2.04 diameter 0.6 hole 0.3
via -3.35,-2.04 diameter 0.6 hole 0.3
via -2.04,-3.35 diameter 0.6 hole 0.3
via -0.68,-3.35 diameter 0.6 hole 0.3
via 0.68,-3.35 diameter 0.6 hole 0.3
via 2.04,-3.35 diameter 0.6 hole 0.3
via -3.35,2.04 diameter 0.6 hole 0.3
via -2.04,2.04 diameter 0.6 hole 0.3
via -0.68,2.04 diameter 0.6 hole 0.3
via 2.04,2.04 diameter 0.6 hole 0.3
via 3.35,2.04 diameter 0.6 hole 0.3
via 0.68,2.04 diameter 0.6 hole 0.3
Top Overlay:
  circle w0.15: c-5.375,4.575 r0.125
  lines w0.15: -4.6,-4.2 -4.6,-4.6 -4.2,-4.6 ; -4.6,4.2 -4.6,4.6 -4.2,4.6 ; 4.2,-4.6 4.6,-4.6 4.6,-4.2 ; 4.2,4.6 4.6,4.6 4.6,4.2
Top Paste:
  rectangle: -3.3,-3.335 -2.14,-2.175
  rectangle: -1.94,-3.335 -0.78,-2.175
  rectangle: -0.58,-3.335 0.58,-2.175
  rectangle: 0.78,-3.335 1.94,-2.175
  rectangle: -3.3,-1.975 -2.14,-0.815
  rectangle: -1.94,-1.975 -0.78,-0.815
  rectangle: -0.58,-1.975 0.58,-0.815
  rectangle: 0.78,-1.975 1.94,-0.815
  rectangle: -3.3,-0.615 -2.14,0.545
  rectangle: -1.94,-0.615 -0.78,0.545
  rectangle: -0.58,-0.615 0.58,0.545
  rectangle: 0.78,-0.615 1.94,0.545
  rectangle: -3.3,0.745 -2.14,1.905
  rectangle: -1.94,0.745 -0.78,1.905
  rectangle: -0.58,0.745 0.58,1.905
  rectangle: 0.78,0.745 1.94,1.905
  rectangle: 2.14,0.745 3.3,1.905
  rectangle: 2.14,-0.615 3.3,0.545
  rectangle: 2.14,-1.975 3.3,-0.815
  rectangle: 2.14,-3.335 3.3,-2.175
  rectangle: 2.14,2.105 3.3,3.265
  rectangle: 0.78,2.105 1.94,3.265
  rectangle: -0.58,2.105 0.58,3.265
  rectangle: -1.94,2.105 -0.78,3.265
  rectangle: -3.3,2.105 -2.14,3.265
Bottom Solder:
  rectangle: -3.8,-3.8 3.8,3.8
TopAssy 13:
  circle w0.15: c-3.675,3.675 r0.5
  lines w0.15: -4.6,-3.813 -4.6,-3.688 ; -4.6,-3.313 -4.6,-3.187 ; -4.6,-2.813 -4.6,-2.688 ; -4.6,-2.313 -4.6,-2.188 ; -4.6,-1.813 -4.6,-1.688 ; -4.6,-1.313 -4.6,-1.188 ; -4.6,-0.813 -4.6,-0.687 ; -4.6,-0.313 -4.6,-0.188 ; -4.6,0.187 -4.6,0.312 ; -4.6,0.687 -4.6,0.812 ; -4.6,1.187 -4.6,1.312 ; -4.6,1.687 -4.6,1.813 ; -4.6,2.187 -4.6,2.312 ; -4.6,2.687 -4.6,2.812 ; -4.6,3.187 -4.6,3.312 ; -4.6,3.687 -4.6,3.812 ; -3.812,-4.6 -3.687,-4.6 ; -3.813,4.6 -3.688,4.6 ; -3.312,-4.6 -3.187,-4.6 ; -3.313,4.6 -3.187,4.6 ; -2.812,-4.6 -2.687,-4.6 ; -2.813,4.6 -2.688,4.6 ; -2.312,-4.6 -2.187,-4.6 ; -2.313,4.6 -2.188,4.6 ; -1.813,-4.6 -1.687,-4.6 ; -1.813,4.6 -1.688,4.6 ; -1.312,-4.6 -1.187,-4.6 ; -1.313,4.6 -1.188,4.6 ; -0.812,-4.6 -0.687,-4.6 ; -0.813,4.6 -0.687,4.6 ; -0.312,-4.6 -0.187,-4.6 ; -0.313,4.6 -0.188,4.6 ; 0.188,-4.6 0.313,-4.6 ; 0.187,4.6 0.312,4.6 ; 0.687,-4.6 0.813,-4.6 ; 0.687,4.6 0.812,4.6 ; 1.188,-4.6 1.313,-4.6 ; 1.187,4.6 1.312,4.6 ; 1.688,-4.6 1.813,-4.6 ; 1.687,4.6 1.813,4.6 ; 2.188,-4.6 2.313,-4.6 ; 2.187,4.6 2.312,4.6 ; 2.688,-4.6 2.813,-4.6 ; 2.687,4.6 2.812,4.6 ; 3.187,-4.6 3.313,-4.6 ; 3.187,4.6 3.312,4.6 ; 3.688,-4.6 3.813,-4.6 ; 3.687,4.6 3.812,4.6 ; 4.6,-3.812 4.6,-3.687 ; 4.6,-3.312 4.6,-3.187 ; 4.6,-2.812 4.6,-2.687 ; 4.6,-2.312 4.6,-2.187 ; 4.6,-1.813 4.6,-1.687 ; 4.6,-1.312 4.6,-1.187 ; 4.6,-0.812 4.6,-0.687 ; 4.6,-0.312 4.6,-0.187 ; 4.6,0.188 4.6,0.313 ; 4.6,0.687 4.6,0.813 ; 4.6,1.188 4.6,1.313 ; 4.6,1.688 4.6,1.813 ; 4.6,2.188 4.6,2.313 ; 4.6,2.688 4.6,2.813 ; 4.6,3.187 4.6,3.313 ; 4.6,3.688 4.6,3.813 ; -4.5,-4.5 4.5,-4.5 4.5,4.5 -4.5,4.5 -4.5,-4.5
CourtTop 15:
  lines w0.05: -0.5,0 0.5,0 ; 0,-0.5 0,0.5 ; -5.125,-5.125 5.125,-5.125 5.125,5.125 -5.125,5.125 -5.125,-5.125
3D body "User Library-QFN64-2.step": height 0.9, standoff 0, extent -4.52,-4.52 4.52,4.52

## QFP100P50_1600X1600X160L60X22N [mm] "Quad Flat Pack (QFP), 0.50 mm pitch; square, 25 pin X 25 pin, 14.00 mm L X 14.00 mm W X 1.60 mm H body"
height 1.6
pads (100):
  rrect53% 1.26x0.25 smd mask+0.075: 1(-7.63,6) 2(-7.63,5.5) 3(-7.63,5) 4(-7.63,4.5) 5(-7.63,4) 6(-7.63,3.5) 7(-7.63,3) 8(-7.63,2.5) 9(-7.63,2) 10(-7.63,1.5) 11(-7.63,1) 12(-7.63,0.5) 13(-7.63,0) 14(-7.63,-0.5) 15(-7.63,-1) 16(-7.63,-1.5) 17(-7.63,-2) 18(-7.63,-2.5) 19(-7.63,-3) 20(-7.63,-3.5) 21(-7.63,-4) 22(-7.63,-4.5) 23(-7.63,-5) 24(-7.63,-5.5) 25(-7.63,-6) 51(7.63,-6) 52(7.63,-5.5) 53(7.63,-5) 54(7.63,-4.5) 55(7.63,-4) 56(7.63,-3.5) 57(7.63,-3) 58(7.63,-2.5) 59(7.63,-2) 60(7.63,-1.5) 61(7.63,-1) 62(7.63,-0.5) 63(7.63,0) 64(7.63,0.5) 65(7.63,1) 66(7.63,1.5) 67(7.63,2) 68(7.63,2.5) 69(7.63,3) 70(7.63,3.5) 71(7.63,4) 72(7.63,4.5) 73(7.63,5) 74(7.63,5.5) 75(7.63,6)
  rrect53% 0.25x1.26 smd mask+0.075: 26(-6,-7.63) 27(-5.5,-7.63) 28(-5,-7.63) 29(-4.5,-7.63) 30(-4,-7.63) 31(-3.5,-7.63) 32(-3,-7.63) 33(-2.5,-7.63) 34(-2,-7.63) 35(-1.5,-7.63) 36(-1,-7.63) 37(-0.5,-7.63) 38(0,-7.63) 39(0.5,-7.63) 40(1,-7.63) 41(1.5,-7.63) 42(2,-7.63) 43(2.5,-7.63) 44(3,-7.63) 45(3.5,-7.63) 46(4,-7.63) 47(4.5,-7.63) 48(5,-7.63) 49(5.5,-7.63) 50(6,-7.63) 76(6,7.63) 77(5.5,7.63) 78(5,7.63) 79(4.5,7.63) 80(4,7.63) 81(3.5,7.63) 82(3,7.63) 83(2.5,7.63) 84(2,7.63) 85(1.5,7.63) 86(1,7.63) 87(0.5,7.63) 88(0,7.63) 89(-0.5,7.63) 90(-1,7.63) 91(-1.5,7.63) 92(-2,7.63) 93(-2.5,7.63) 94(-3,7.63) 95(-3.5,7.63) 96(-4,7.63) 97(-4.5,7.63) 98(-5,7.63) 99(-5.5,7.63) 100(-6,7.63)
Top Overlay:
  circle w0.15: c-7.675,6.8 r0.168
  circle w0.15: c-7.675,6.8 r0.079
  lines w0.12: -7.1,-6.5 -7.1,-7.1 -6.5,-7.1 ; -7.1,6.5 -7.1,7.1 -6.5,7.1 ; 6.5,-7.1 7.1,-7.1 7.1,-6.5 ; 6.5,7.1 7.1,7.1 7.1,6.5
TopAssy 13:
  drawing of 406 lines, arcs and shapes, not listed
CourtTop 15:
  circle w0.05: c0,0 r0.25
  lines w0.05: -0.35,0 0.35,0 ; 0,-0.35 0,0.35 ; -8.46,-6.35 -7.3,-6.35 -7.3,-7.3 -6.35,-7.3 -6.35,-8.46 6.35,-8.46 6.35,-7.3 7.3,-7.3 7.3,-6.35 8.46,-6.35 8.46,6.35 7.3,6.35 7.3,7.3 6.35,7.3 6.35,8.46 -6.35,8.46 -6.35,7.3 -8,7.3 -8,6.35 -8.46,6.35 -8.46,-6.35
3D body "QFP100P50_1600X1600X160L60X22.STEP": height 1.6, standoff 0, extent -8,-8 8,8